# Altium footprint library PcbLib1.PcbLib: 1009 footprints (part 9 of 64)
Each footprint in its own frame and in the unit in brackets; x right, y up, seen from the top. Pads: shape width x height; smd on the part's side, far side on the other; paste and mask are expansions set on the pad; w line width, h text height; cw(c..) or ccw(c..) is an arc to the next point about the centre after c.
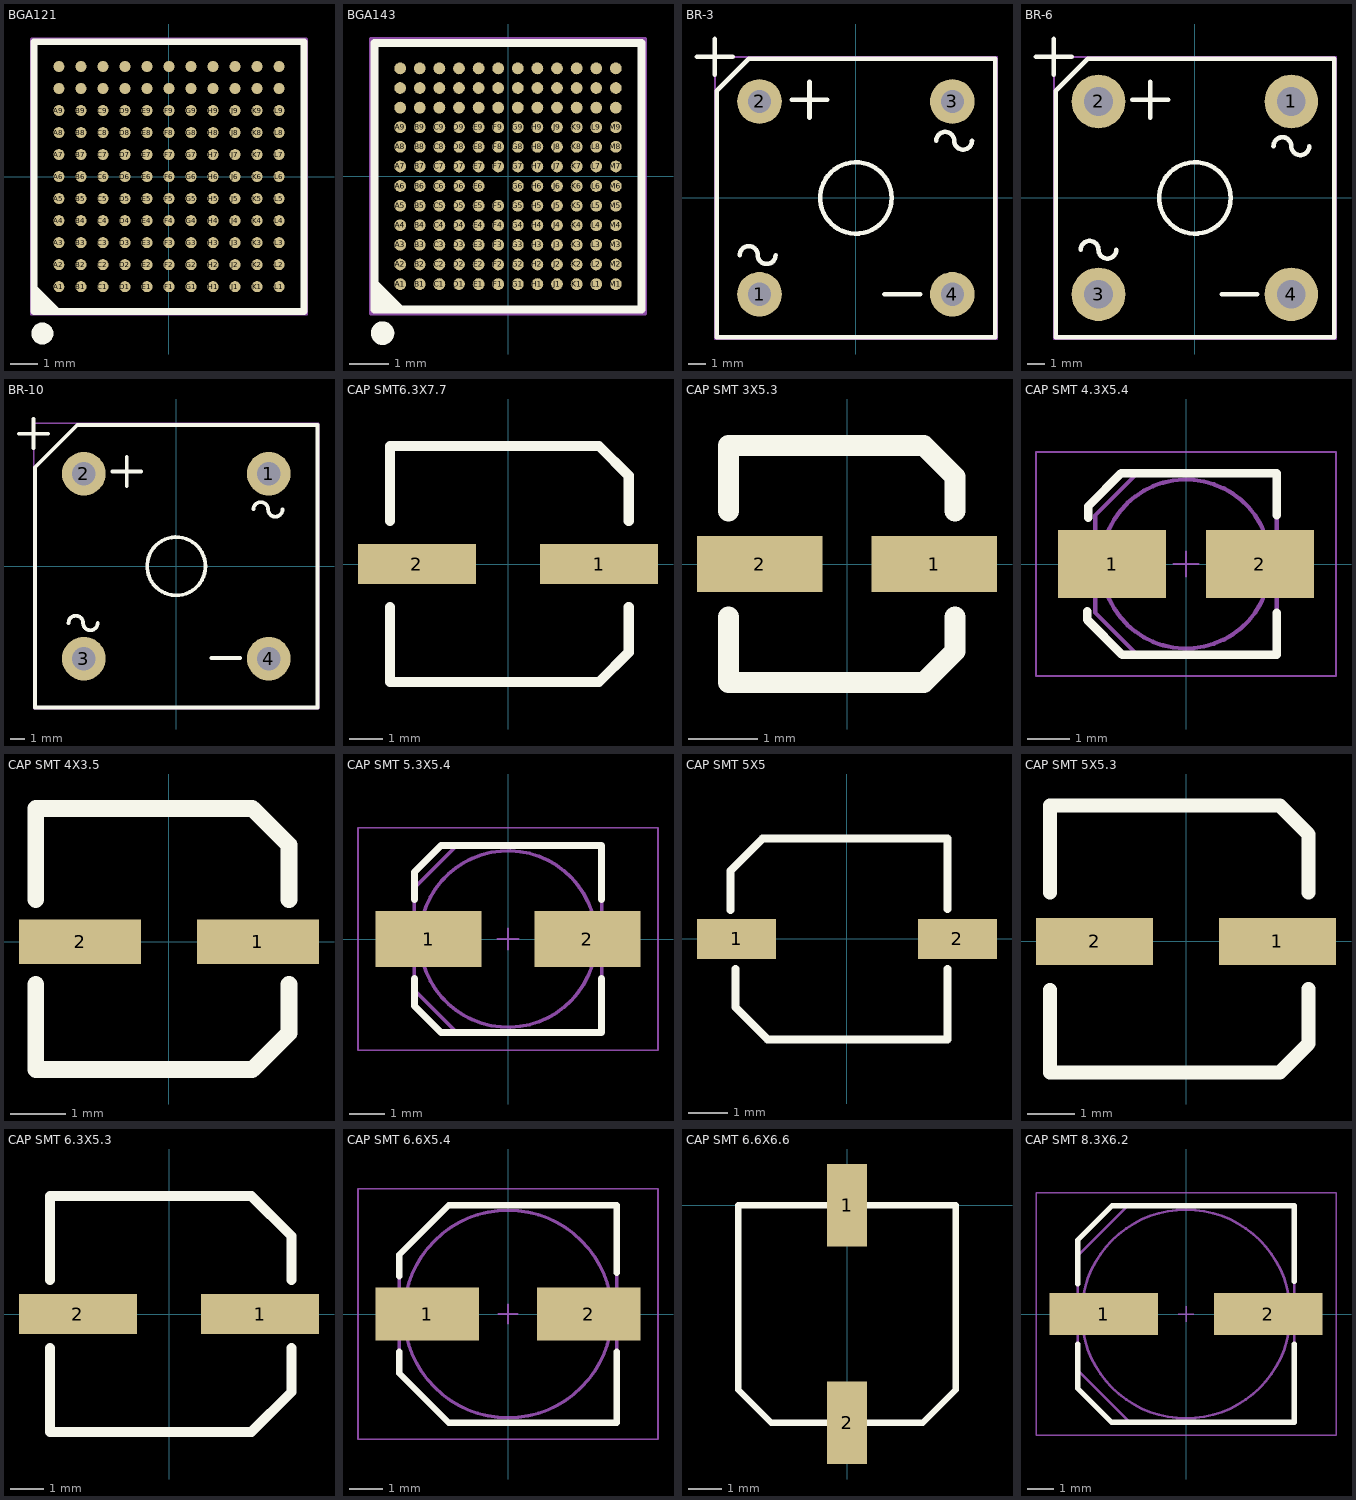
[diagram p8: the footprints below, top view; thin cyan lines are the x and y axes]

## BGA121 [mm]
pads (121):
  round 0.4 smd mask+0.051: A1(-4,-4) A2(-4,-3.2) A3(-4,-2.4) A4(-4,-1.6) A5(-4,-0.8) A6(-4,0) A7(-4,0.8) A8(-4,1.6) A9(-4,2.4) A10(-4,3.2) A11(-4,4) B1(-3.2,-4) B2(-3.2,-3.2) B3(-3.2,-2.4) B4(-3.2,-1.6) B5(-3.2,-0.8) B6(-3.2,0) B7(-3.2,0.8) B8(-3.2,1.6) B9(-3.2,2.4) B10(-3.2,3.2) B11(-3.2,4) C1(-2.4,-4) C2(-2.4,-3.2) C3(-2.4,-2.4) C4(-2.4,-1.6) C5(-2.4,-0.8) C6(-2.4,0) C7(-2.4,0.8) C8(-2.4,1.6) C9(-2.4,2.4) C10(-2.4,3.2) C11(-2.4,4) D1(-1.6,-4) D2(-1.6,-3.2) D3(-1.6,-2.4) D4(-1.6,-1.6) D5(-1.6,-0.8) D6(-1.6,0) D7(-1.6,0.8) D8(-1.6,1.6) D9(-1.6,2.4) D10(-1.6,3.2) D11(-1.6,4) E1(-0.8,-4) E2(-0.8,-3.2) E3(-0.8,-2.4) E4(-0.8,-1.6) E5(-0.8,-0.8) E6(-0.8,0) E7(-0.8,0.8) E8(-0.8,1.6) E9(-0.8,2.4) E10(-0.8,3.2) E11(-0.8,4) F1(0,-4) F2(0,-3.2) F3(0,-2.4) F4(0,-1.6) F5(0,-0.8) F6(0,0) F7(0,0.8) F8(0,1.6) F9(0,2.4) F10(0,3.2) F11(0,4) G1(0.8,-4) G2(0.8,-3.2) G3(0.8,-2.4) G4(0.8,-1.6) G5(0.8,-0.8) G6(0.8,0) G7(0.8,0.8) G8(0.8,1.6) G9(0.8,2.4) G10(0.8,3.2) G11(0.8,4) H1(1.6,-4) H2(1.6,-3.2) H3(1.6,-2.4) H4(1.6,-1.6) H5(1.6,-0.8) H6(1.6,0) H7(1.6,0.8) H8(1.6,1.6) H9(1.6,2.4) H10(1.6,3.2) H11(1.6,4) J1(2.4,-4) J2(2.4,-3.2) J3(2.4,-2.4) J4(2.4,-1.6) J5(2.4,-0.8) J6(2.4,0) J7(2.4,0.8) J8(2.4,1.6) J9(2.4,2.4) J10(2.4,3.2) J11(2.4,4) K1(3.2,-4) K2(3.2,-3.2) K3(3.2,-2.4) K4(3.2,-1.6) K5(3.2,-0.8) K6(3.2,0) K7(3.2,0.8) K8(3.2,1.6) K9(3.2,2.4) K10(3.2,3.2) K11(3.2,4) L1(4,-4) L2(4,-3.2) L3(4,-2.4) L4(4,-1.6) L5(4,-0.8) L6(4,0) L7(4,0.8) L8(4,1.6) L9(4,2.4) L10(4,3.2) L11(4,4)
Top Overlay:
  circle w0.4: c-4.6,-5.7 r0.2
  region: -4.868,-4.863 -3.937,-4.863 -4.863,-3.937 -4.868,-3.937
  lines w0.254: -4.9,-4.9 4.9,-4.9 4.9,4.9 -4.9,4.9 -4.9,-4.9
Mechanical 13:
  lines w0.1: -5,-5 -5,5 5,5 5,-5 -5,-5

## BGA143 [mm]
pads (143):
  round 0.3 smd mask+0.051: A1(-2.75,-2.75) A2(-2.75,-2.25) A3(-2.75,-1.75) A4(-2.75,-1.25) A5(-2.75,-0.75) A6(-2.75,-0.25) A7(-2.75,0.25) A8(-2.75,0.75) A9(-2.75,1.25) A10(-2.75,1.75) A11(-2.75,2.25) A12(-2.75,2.75) B1(-2.25,-2.75) B2(-2.25,-2.25) B3(-2.25,-1.75) B4(-2.25,-1.25) B5(-2.25,-0.75) B6(-2.25,-0.25) B7(-2.25,0.25) B8(-2.25,0.75) B9(-2.25,1.25) B10(-2.25,1.75) B11(-2.25,2.25) B12(-2.25,2.75) C1(-1.75,-2.75) C2(-1.75,-2.25) C3(-1.75,-1.75) C4(-1.75,-1.25) C5(-1.75,-0.75) C6(-1.75,-0.25) C7(-1.75,0.25) C8(-1.75,0.75) C9(-1.75,1.25) C10(-1.75,1.75) C11(-1.75,2.25) C12(-1.75,2.75) D1(-1.25,-2.75) D2(-1.25,-2.25) D3(-1.25,-1.75) D4(-1.25,-1.25) D5(-1.25,-0.75) D6(-1.25,-0.25) D7(-1.25,0.25) D8(-1.25,0.75) D9(-1.25,1.25) D10(-1.25,1.75) D11(-1.25,2.25) D12(-1.25,2.75) E1(-0.75,-2.75) E2(-0.75,-2.25) E3(-0.75,-1.75) E4(-0.75,-1.25) E5(-0.75,-0.75) E6(-0.75,-0.25) E7(-0.75,0.25) E8(-0.75,0.75) E9(-0.75,1.25) E10(-0.75,1.75) E11(-0.75,2.25) E12(-0.75,2.75) F1(-0.25,-2.75) F2(-0.25,-2.25) F3(-0.25,-1.75) F4(-0.25,-1.25) F5(-0.25,-0.75) F7(-0.25,0.25) F8(-0.25,0.75) F9(-0.25,1.25) F10(-0.25,1.75) F11(-0.25,2.25) F12(-0.25,2.75) G1(0.25,-2.75) G2(0.25,-2.25) G3(0.25,-1.75) G4(0.25,-1.25) G5(0.25,-0.75) G6(0.25,-0.25) G7(0.25,0.25) G8(0.25,0.75) G9(0.25,1.25) G10(0.25,1.75) G11(0.25,2.25) G12(0.25,2.75) H1(0.75,-2.75) H2(0.75,-2.25) H3(0.75,-1.75) H4(0.75,-1.25) H5(0.75,-0.75) H6(0.75,-0.25) H7(0.75,0.25) H8(0.75,0.75) H9(0.75,1.25) H10(0.75,1.75) H11(0.75,2.25) H12(0.75,2.75) J1(1.25,-2.75) J2(1.25,-2.25) J3(1.25,-1.75) J4(1.25,-1.25) J5(1.25,-0.75) J6(1.25,-0.25) J7(1.25,0.25) J8(1.25,0.75) J9(1.25,1.25) J10(1.25,1.75) J11(1.25,2.25) J12(1.25,2.75) K1(1.75,-2.75) K2(1.75,-2.25) K3(1.75,-1.75) K4(1.75,-1.25) K5(1.75,-0.75) K6(1.75,-0.25) K7(1.75,0.25) K8(1.75,0.75) K9(1.75,1.25) K10(1.75,1.75) K11(1.75,2.25) K12(1.75,2.75) L1(2.25,-2.75) L2(2.25,-2.25) L3(2.25,-1.75) L4(2.25,-1.25) L5(2.25,-0.75) L6(2.25,-0.25) L7(2.25,0.25) L8(2.25,0.75) L9(2.25,1.25) L10(2.25,1.75) L11(2.25,2.25) L12(2.25,2.75) M1(2.75,-2.75) M2(2.75,-2.25) M3(2.75,-1.75) M4(2.75,-1.25) M5(2.75,-0.75) M6(2.75,-0.25) M7(2.75,0.25) M8(2.75,0.75) M9(2.75,1.25) M10(2.75,1.75) M11(2.75,2.25) M12(2.75,2.75)
Top Overlay:
  circle w0.3: c-3.2,-4 r0.15
  region: -3.45,-3.45 -2.55,-3.45 -2.75,-3.25 -3.45,-2.55
  lines w0.2: -3.4,-3.4 3.4,-3.4 3.4,3.4 -3.4,3.4 -3.4,-3.4
Mechanical 13:
  lines w0.1: -3.5,-3.5 -3.5,3.5 3.5,3.5 3.5,-3.5 -3.5,-3.5

## BR-3 [mm]
pads (4):
  round 2.5 hole 1.3: 1(-5.4,-5.4) 2(-5.4,5.4) 3(5.4,5.4) 4(5.4,-5.4)
Top Overlay:
  circle w0.254: c0,0 r2
  lines w0.254: -8.9,7.9 -6.9,7.9 ; -7.9,6.9 -7.9,8.9 ; -6.5,-3.2 cw(c-6,-3.2) -5.5,-3.2 ccw(c-5,-3.2) -4.5,-3.2 ; -3.6,5.5 -1.6,5.5 ; -2.6,4.5 -2.6,6.5 ; 1.6,-5.4 3.6,-5.4 ; 4.5,3.2 cw(c5,3.2) 5.5,3.2 ccw(c6,3.2) 6.5,3.2 ; -7.8,-7.8 7.8,-7.8 7.8,7.8 -6,7.8 -7.8,6 -7.8,-7.8
Mechanical 13:
  lines w0.1: -7.9,-7.9 7.9,-7.9 7.9,7.9 -7.9,7.9 -7.9,-7.9

## BR-6 [mm]
pads (4):
  round 3 hole 1.6: 1(5.4,5.4) 2(-5.4,5.4) 3(-5.4,-5.4) 4(5.4,-5.4)
Top Overlay:
  circle w0.254: c0,0 r2
  lines w0.254: -8.9,7.9 -6.9,7.9 ; -7.9,6.9 -7.9,8.9 ; -6.4,-2.9 cw(c-5.9,-2.9) -5.4,-2.9 ccw(c-4.9,-2.9) -4.4,-2.9 ; -3.5,5.5 -1.5,5.5 ; -2.5,4.5 -2.5,6.5 ; 1.5,-5.4 3.5,-5.4 ; 4.4,2.9 cw(c4.9,2.9) 5.4,2.9 ccw(c5.9,2.9) 6.4,2.9 ; -7.8,-7.8 7.8,-7.8 7.8,7.8 -6,7.8 -7.8,6 -7.8,-7.8
Mechanical 13:
  lines w0.1: -7.9,-7.9 7.9,-7.9 7.9,7.9 -7.9,7.9 -7.9,-7.9

## BR-10 [mm]
pads (4):
  round 3 hole 1.6: 1(6.35,6.35) 2(-6.35,6.35) 3(-6.35,-6.35) 4(6.35,-6.35)
Top Overlay:
  circle w0.254: c0,0 r2
  lines w0.254: -10.8,9.1 -8.8,9.1 ; -9.8,8.1 -9.8,10.1 ; -7.4,-3.9 cw(c-6.9,-3.9) -6.4,-3.9 ccw(c-5.9,-3.9) -5.4,-3.9 ; -4.4,6.5 -2.4,6.5 ; -3.4,5.5 -3.4,7.5 ; 2.4,-6.3 4.4,-6.3 ; 5.3,3.9 cw(c5.8,3.9) 6.3,3.9 ccw(c6.8,3.9) 7.3,3.9 ; -9.7,-9.7 9.7,-9.7 9.7,9.7 -6.8,9.7 -9.7,6.8 -9.7,-9.7
Mechanical 13:
  lines w0.1: -9.8,-9.8 9.8,-9.8 9.8,9.8 -9.8,9.8 -9.8,-9.8

## CAP SMT6.3X7.7 [mm]
pads (2):
  rect 3.5x1.2 smd: 1(2.7,0) 2(-2.7,0)
Top Overlay:
  lines w0.3: -3.5,-1.27 -3.5,-3.5 2.7,-3.5 3.581,-2.619 3.581,-1.27 ; -3.5,1.27 -3.5,3.5 2.7,3.5 3.581,2.619 3.581,1.27
3D body "p350-120.stp": height 0.02, standoff 0, extent -4.45,-0.6 -0.95,0.6
3D body "p350-120.stp": height 0.02, standoff 0, extent 0.95,-0.6 4.45,0.6
3D body "3d_6_3x7_7-aecap.stp": height 7.7, standoff 0, extent -4.1,-3.3 4.1,3.3

## CAP SMT 3X5.3 [mm]
pads (2):
  rect 1.8x0.8 smd: 1(1.25,0) 2(-1.25,0)
Top Overlay:
  lines w0.3: -1.7,-0.762 -1.7,-1.7 1.1,-1.7 1.549,-1.251 1.549,-0.762 ; -1.7,0.762 -1.7,1.7 1.1,1.7 1.549,1.251 1.549,0.762
3D body "p180-080.stp": height 0.02, standoff 0, extent 0.4,-0.4 2.2,0.4
3D body "p180-080.stp": height 0.02, standoff 0, extent -2.2,-0.4 -0.4,0.4
3D body "3d_3x5_3-cap.stp": height 5.3, standoff 0, extent -1.9,-1.5 1.9,1.5
3D body "3d_3x5_3-cap.stp": height 5.31, standoff 0, extent 1.4,-1.6 5.2,1.4
3D body "3d_3x5_3-cap.stp": height 5.31, standoff 0, extent 1.5,-1.6 5.3,1.4
3D body "3d_3x5_3-cap.stp": height 5.31, standoff 0, extent -1.8,-1.6 2,1.4

## CAP SMT 4.3X5.4 [mm] "Capacitor, Aluminium Electrolytric, 4.3mm L X 4.3mm W X 5.4mm H, IPC Medium Density"
height 5.4
pads (2):
  rect 2.55x1.6 smd: 1(-1.75,0) 2(1.75,0)
Top Overlay:
  lines w0.2: -2.337,-1.118 -2.337,-1.321 -1.508,-2.15 2.15,-2.15 2.15,-1.15 ; -2.311,1.092 -2.311,1.372 -1.533,2.15 2.15,2.15 2.15,1.15
Mechanical 14:
  circle w0.1: c0,0 r2
  lines w0.1: -2.15,-1.15 -1.15,-2.15 2.15,-2.15 2.15,2.15 -1.15,2.15 -2.15,1.15 -2.15,-1.15
Mechanical 15:
  lines w0.05: -0.3,0 0.3,0 ; 0,-0.3 0,0.3 ; -3.55,-2.65 -3.55,2.65 3.55,2.65 3.55,-2.65 -3.55,-2.65
3D body "p255-160.stp": height 0.02, standoff 0, extent 0.525,-0.8 3.075,0.8
3D body "p255-160.stp": height 0.02, standoff 0, extent -3.075,-0.8 -0.525,0.8
3D body "CAPAE430X540N.stp": height 5.7, standoff 0, extent -2.75,-2.25 2.75,2.25

## CAP SMT 4X3.5 [mm]
pads (2):
  rect 2.2x0.8 smd: 1(1.6,0) 2(-1.6,0)
Top Overlay:
  lines w0.3: -2.4,-0.762 -2.4,-2.3 1.5,-2.3 2.159,-1.641 2.159,-0.762 ; -2.4,0.762 -2.4,2.4 1.5,2.4 2.159,1.741 2.159,0.762
3D body "p180-080.stp": height 0.02, standoff 0, extent -2.7,-0.4 -0.9,0.4
3D body "p180-080.stp": height 0.02, standoff 0, extent 0.9,-0.4 2.7,0.4
3D body "3d_4x5_3-aecap.stp": height 5.81, standoff 0, extent -2.4,-2.1 2.4,2.2

## CAP SMT 5.3X5.4 [mm] "Capacitor, Aluminium Electrolytric, 5.3mm L X 5.3mm W X 5.4mm H, IPC Medium Density"
height 5.4
pads (2):
  rect 3x1.6 smd: 1(-2.25,0) 2(2.25,0)
Top Overlay:
  lines w0.2: -2.65,-1.118 -2.65,-1.897 -1.897,-2.65 2.65,-2.65 2.65,-1.118 ; -2.65,1.118 -2.65,1.897 -1.897,2.65 2.65,2.65 2.65,1.118
Mechanical 14:
  circle w0.1: c0,0 r2.5
  lines w0.1: -2.65,-1.45 -2.65,1.45 -1.45,2.65 2.65,2.65 2.65,-2.65 -1.45,-2.65 -2.65,-1.45
Mechanical 15:
  lines w0.05: -0.3,0 0.3,0 ; 0,-0.3 0,0.3 ; -4.25,-3.15 4.25,-3.15 4.25,3.15 -4.25,3.15 -4.25,-3.15
3D body "p300-160.stp": height 0.02, standoff 0, extent -3.8,-0.8 -0.8,0.8
3D body "p300-160.stp": height 0.02, standoff 0, extent 0.8,-0.8 3.8,0.8
3D body "CAPAE530X540N.stp": height 5.7, standoff 0, extent -3.25,-2.75 3.25,2.75

## CAP SMT 5X5 [mm]
pads (2):
  rect 2x1 smd: 1(-2.794,0) 2(2.794,0)
Top Overlay:
  lines w0.2: -2.946,0.73 -2.946,1.727 -2.134,2.54 2.54,2.54 2.54,0.762 ; -2.819,-0.762 -2.819,-1.727 -2.007,-2.54 2.54,-2.54 2.54,-0.762
3D body "SL-B.STEP": height 5.2, standoff 0, extent -2.274,-2.15 2.326,2.15

## CAP SMT 5X5.3 [mm]
pads (2):
  rect 2.5x1 smd: 1(1.95,0) 2(-1.95,0)
Top Overlay:
  lines w0.3: -2.9,-1.041 -2.9,-2.8 2,-2.8 2.616,-2.184 2.616,-1.016 ; -2.9,1.041 -2.9,2.9 2,2.9 2.616,2.284 2.616,1.041
3D body "3d_5x5_3-aecap.stp": height 5.66, standoff 0, extent -2.7,-2.6 2.7,2.7
3D body "p250-100.stp": height 0.02, standoff 0, extent -3.25,-0.5 -0.75,0.5
3D body "p250-100.stp": height 0.02, standoff 0, extent 0.75,-0.5 3.25,0.5

## CAP SMT 6.3X5.3 [mm]
pads (2):
  rect 3.5x1.2 smd: 1(2.7,0) 2(-2.7,0)
Top Overlay:
  lines w0.3: -3.531,-1.016 -3.531,-3.5 2.444,-3.5 3.632,-2.311 3.632,-1.016 ; -3.531,1.016 -3.531,3.5 2.444,3.5 3.632,2.311 3.632,1.016
3D body "p350-120.stp": height 0.02, standoff 0, extent 0.95,-0.6 4.45,0.6
3D body "p350-120.stp": height 0.02, standoff 0, extent -4.45,-0.6 -0.95,0.6
3D body "3d_6_3x5_3-aecap.stp": height 5.3, standoff 0, extent -4.1,-3.3 4.1,3.3

## CAP SMT 6.6X5.4 [mm] "Capacitor, Aluminium Electrolytric, 6.6mm L X 6.6mm W X 5.4mm H, IPC Medium Density"
height 5.4
pads (2):
  rect 3.15x1.6 smd: 1(-2.45,0) 2(2.45,0)
Top Overlay:
  lines w0.2: -3.3,-1.15 -3.3,-1.8 -1.8,-3.3 3.3,-3.3 3.3,-1.15 ; -3.3,1.15 -3.3,1.8 -1.8,3.3 3.3,3.3 3.3,1.25
Mechanical 14:
  circle w0.1: c0,0 r3.15
  lines w0.1: -3.3,-1.8 -1.8,-3.3 3.3,-3.3 3.3,3.3 -1.8,3.3 -3.3,1.8 -3.3,-1.8
Mechanical 15:
  lines w0.05: -0.3,0 0.3,0 ; 0,-0.3 0,0.3 ; -4.55,-3.8 -4.55,3.8 4.55,3.8 4.55,-3.8 -4.55,-3.8
3D body "CAPAE660X540N.stp": height 5.7, standoff 0, extent -3.9,-3.4 3.9,3.4
3D body "p300-160.stp": height 0.02, standoff 0, extent -4.1,-0.8 -1.1,0.8
3D body "p300-160.stp": height 0.02, standoff 0, extent 1.1,-0.8 4.1,0.8

## CAP SMT 6.6X6.6 [mm] "SMDC"
pads (2):
  rect 1.2x2.5 smd: 1(0,0) 2(0,-6.6)
Top Overlay:
  lines w0.2: -3.3,-5.6 -2.3,-6.6 2.3,-6.6 3.3,-5.6 3.3,0 0,0 -3.3,0 -3.3,-5.6
3D body "SL-E.STEP": height 5.2, standoff 0, extent -3.275,-6.802 3.325,0.198

## CAP SMT 8.3X6.2 [mm] "Capacitor, Aluminium Electrolytric, 8.3mm L X 8.3mm W X 6.2mm H, IPC Medium Density"
height 6.2
pads (2):
  rect 4.15x1.6 smd: 1(-3.15,0) 2(3.15,0)
Top Overlay:
  lines w0.2: -4.15,-1.15 -4.15,-2.86 -2.86,-4.15 4.15,-4.15 4.15,-1.15 ; -4.15,1.15 -4.15,2.835 -2.835,4.15 4.15,4.15 4.15,1.25
Mechanical 14:
  circle w0.1: c0,0 r4
  lines w0.1: -4.15,-2.15 -4.15,2.225 -2.225,4.15 4.15,4.15 4.15,-4.15 -2.15,-4.15 -4.15,-2.15
Mechanical 15:
  lines w0.05: -0.3,0 0.3,0 ; 0,-0.3 0,0.3 ; -5.75,-4.65 5.75,-4.65 5.75,4.65 -5.75,4.65 -5.75,-4.65
3D body "p300-160.stp": height 0.02, standoff 0, extent -5.3,-0.8 -2.3,0.8
3D body "p300-160.stp": height 0.02, standoff 0, extent 2.3,-0.8 5.3,0.8
3D body "CAPAE830X620N.stp": height 6.2, standoff 0, extent -4.75,-4.25 4.75,4.25